# Altium footprint library 2.52-直插元件.PcbLib: 467 footprints (part 3 of 30)
Each footprint in its own frame and in the unit in brackets; x right, y up, seen from the top. Pads: shape width x height; smd on the part's side, far side on the other; paste and mask are expansions set on the pad; w line width, h text height; cw(c..) or ccw(c..) is an arc to the next point about the centre after c.
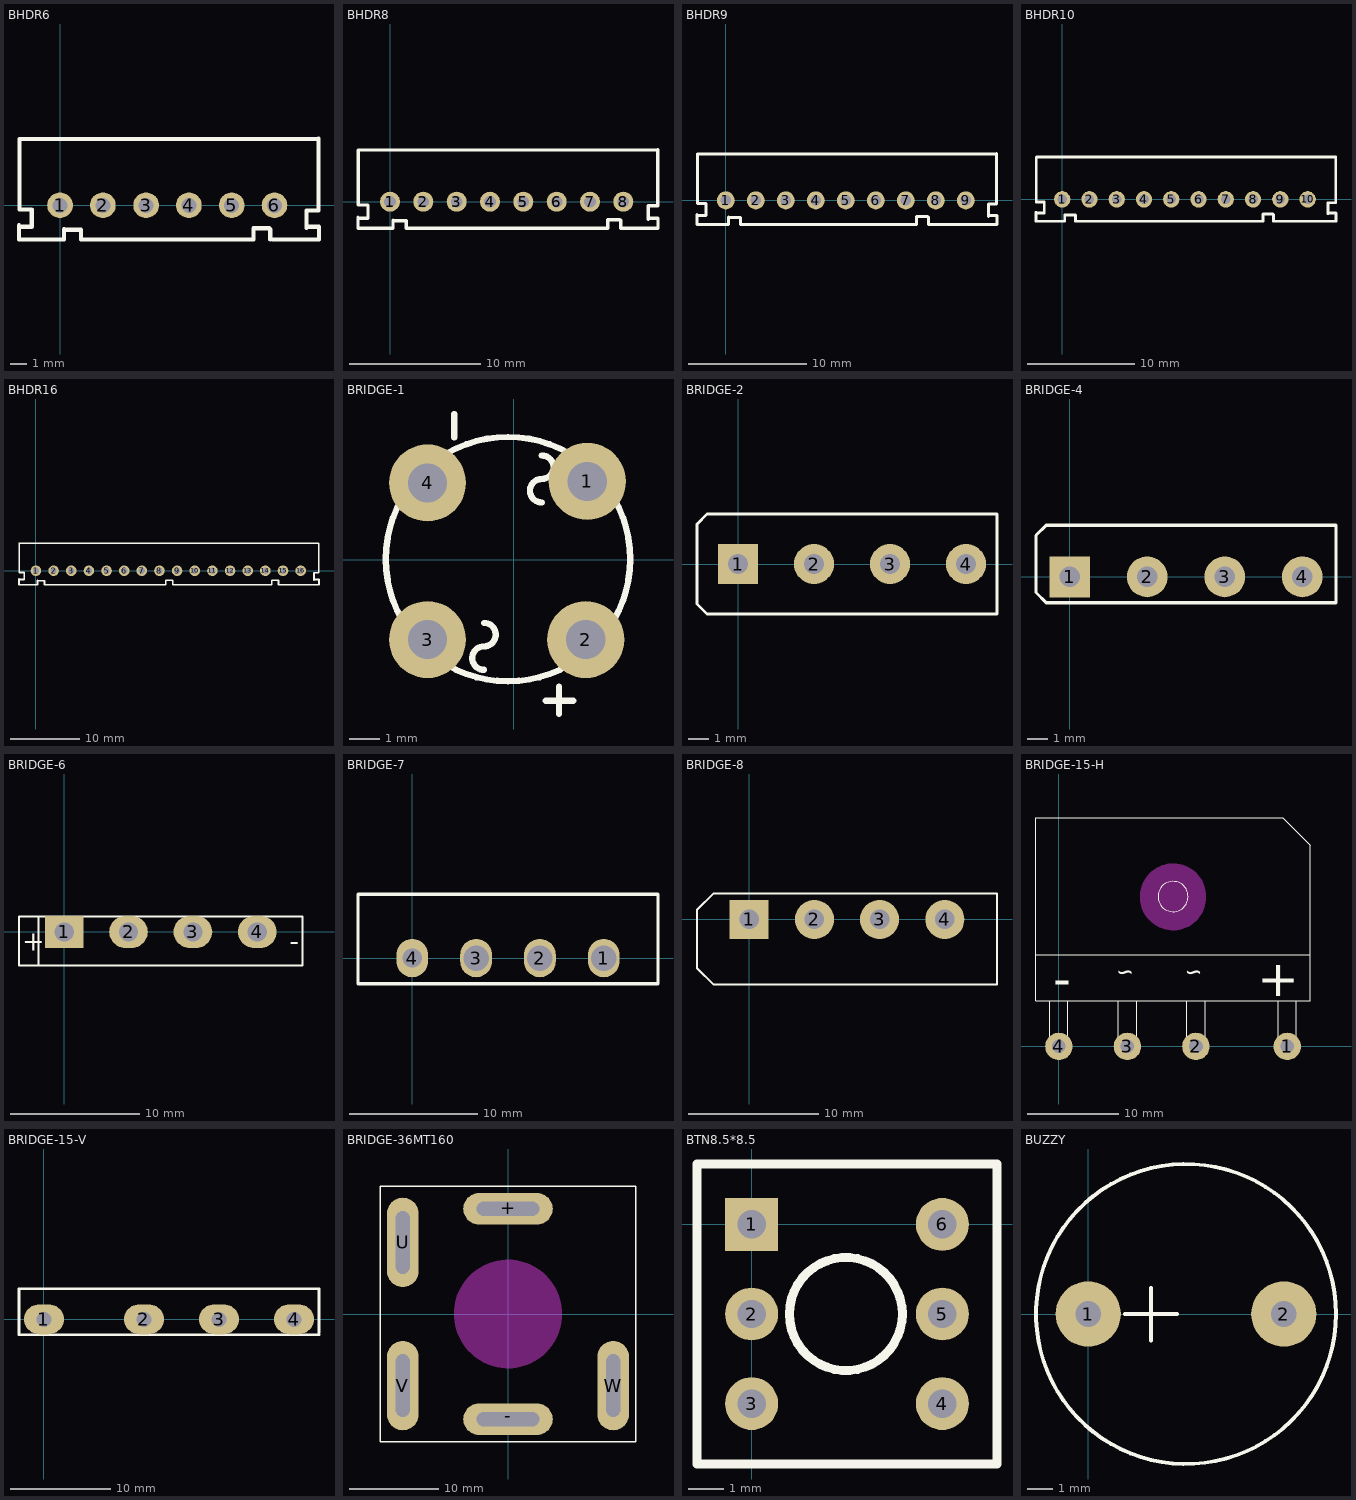
[diagram p2: the footprints below, top view; thin cyan lines are the x and y axes]

## BHDR6 [mil]
pads (6):
  round 60 hole 35: 1(0,0) 2(100,0) 3(201,0) 4(301,0) 5(401,0) 6(501,0)
Top Overlay:
  lines w10: -96,-50 -66,-50 -66,-10 -95,-10 -95,134 ; -96,-47 -96,-80 ; -95,-79 -96,-80 ; -95,103 -95,154 -94,155 -31,155 ; -73,155 93,155 ; 82,155 575,155 ; 276,155 442,155 ; 376,155 495,155 602,155 ; 491,-80 491,-56 489,-54 452,-54 452,-80 49,-80 49,-57 10,-57 9,-56 9,-80 -96,-80 ; 496,-80 601,-80 ; 576,-53 576,-12 604,-12 604,156 ; 576,-50 605,-50 605,-80

## BHDR8 [mil]
pads (8):
  round 60 hole 35: 1(0,0) 2(100,0) 3(200,0) 4(300,0) 5(400,0) 6(500,0) 7(600,0) 8(700,0)
Top Overlay:
  lines w10: -96,-50 -66,-50 -66,-10 -95,-10 -95,134 ; -96,-47 -96,-80 ; -95,-79 -96,-80 ; -95,103 -95,154 -94,155 -31,155 ; -73,155 93,155 ; 82,155 575,155 694,155 801,155 ; 168,155 439,155 ; 200,-80 248,-80 ; 371,-80 653,-80 653,-54 690,-54 692,-56 692,-80 ; 458,-80 49,-80 49,-57 10,-57 9,-56 9,-80 -96,-80 ; 475,155 641,155 ; 695,-80 800,-80 ; 775,-53 775,-12 803,-12 803,156 ; 775,-50 804,-50 804,-80

## BHDR9 [mil]
pads (9):
  round 60 hole 35: 1(0,0) 2(100,0) 3(200,0) 4(300,0) 5(400,0) 6(500,0) 7(600,0) 8(700,0) 9(800,0)
Top Overlay:
  lines w10: -96,-50 -66,-50 -66,-10 -95,-10 -95,134 ; -96,-47 -96,-80 ; -95,-79 -96,-80 ; -95,103 -95,154 -94,155 -31,155 ; -73,155 93,155 ; 82,155 575,155 741,155 ; 168,155 439,155 ; 200,-80 248,-80 ; 371,-80 636,-80 636,-54 673,-54 675,-56 675,-80 774,-80 ; 458,-80 49,-80 49,-57 10,-57 9,-56 9,-80 -96,-80 ; 675,155 794,155 901,155 ; 743,-80 795,-80 900,-80 ; 875,-53 875,-12 903,-12 903,156 ; 875,-50 904,-50 904,-80

## BHDR10 [mil]
pads (10):
  round 60 hole 35: 1(0,0) 2(100,0) 3(200,0) 4(300,0) 5(400,0) 6(500,0) 7(600,0) 8(700,0) 9(800,0) 10(900,0)
Top Overlay:
  lines w10: -96,-50 -66,-50 -66,-10 -95,-10 -95,134 ; -96,-47 -96,-80 ; -95,-79 -96,-80 ; -95,103 -95,154 -94,155 -31,155 ; -73,155 93,155 ; 82,155 675,155 841,155 ; 168,155 439,155 ; 200,-80 248,-80 ; 371,-80 736,-80 736,-54 773,-54 775,-56 775,-80 874,-80 ; 458,-80 49,-80 49,-57 10,-57 9,-56 9,-80 -96,-80 ; 775,155 894,155 1001,155 ; 843,-80 895,-80 1000,-80 ; 975,-53 975,-12 1003,-12 1003,156 ; 975,-50 1004,-50 1004,-80

## BHDR16 [mil]
pads (16):
  round 60 hole 35: 1(0,0) 2(100,0) 3(200,0) 4(300,0) 5(400,0) 6(500,0) 7(600,0) 8(700,0) 9(800,0) 10(900,0) 11(1000,0) 12(1100,0) 13(1200,0) 14(1300,0) 15(1400,0) 16(1500,0)
Top Overlay:
  lines w10: -96,-50 -66,-50 -66,-10 -95,-10 -95,134 ; -96,-47 -96,-80 ; -95,-79 -96,-80 ; -95,103 -95,154 -94,155 -31,155 ; -73,155 93,155 ; 82,155 675,155 841,155 ; 168,155 439,155 ; 200,-80 248,-80 ; 371,-80 736,-80 736,-54 773,-54 775,-56 775,-80 874,-80 ; 458,-80 49,-80 49,-57 10,-57 9,-56 9,-80 -96,-80 ; 775,155 894,155 1295,155 ; 843,-80 895,-80 1000,-80 ; 971,-80 1336,-80 1336,-54 1373,-54 1375,-56 1375,-80 1474,-80 ; 1275,155 1441,155 ; 1375,155 1494,155 1601,155 ; 1443,-80 1495,-80 1600,-80 ; 1575,-53 1575,-12 1603,-12 1603,156 ; 1575,-50 1604,-50 1604,-80

## BRIDGE-1 [mm] "淘宝ID:黄晶宝石   店铺网址:https://shop463601444.taobao.com"
pads (4):
  round 2.5 hole 1.27: 1(2.388,2.54) 2(2.337,-2.591) 3(-2.794,-2.591) 4(-2.794,2.489)
Top Overlay:
  circle w0.203: c-0.184,0.018 r3.962
  lines w0.203: -1.93,3.962 -1.93,4.724 ; -0.963,-3.573 cw(c-0.963,-3.192) -0.963,-2.811 ccw(c-0.963,-2.43) -0.963,-2.049 ; 0.91,1.856 cw(c0.91,2.237) 0.91,2.618 ccw(c0.91,2.999) 0.91,3.38 ; 1.041,-4.572 1.93,-4.572 ; 1.473,-5.004 1.473,-4.115
3D body "User Library-Silicon Bridge Rectifiers 2W10.STEP": height 7.62, standoff -10.38, extent -4.724,-4.449 4.276,4.551

## BRIDGE-2 [mm] "淘宝ID:黄晶宝石   店铺网址:https://shop463601444.taobao.com"
pads (4):
  rect 2x2 hole 1: 1(0,0)
  round 2 hole 1: 2(3.8,0) 3(7.6,0) 4(11.4,0)
Top Overlay:
  lines w0.15: -2.053,-1.997 -2.053,2.003 -2.047,2.003 -1.55,2.5 12.95,2.5 12.95,-2.5 -1.55,-2.5 -2.053,-1.997 ; -2.053,-1.997 -2.053,-1.997
3D body "User Library-3N246.step": height 12.59, standoff -13.79, extent -1.477,-2.419 13.243,2.425

## BRIDGE-4 [mm] "淘宝ID:黄晶宝石   店铺网址:https://shop463601444.taobao.com"
pads (4):
  rect 2x2 hole 1: 1(0,0)
  round 2 hole 1: 2(3.8,0) 3(7.6,0) 4(11.4,0)
Top Overlay:
  lines w0.15: -1.65,-0.767 -1.147,-1.27 13.05,-1.27 13.05,2.53 -1.153,2.53 -1.65,2.033 -1.65,-0.767
3D body "零?": height 12.09, standoff -4.09, extent -1.665,-1.27 13.065,2.53

## BRIDGE-6 [mm] "淘宝ID:黄晶宝石   店铺网址:https://shop463601444.taobao.com"
pads (4):
  rect 3x2.5 hole 1.5: 1(0,0)
  oval 3x2.5 hole 1.5: 2(5,0) 3(10,0) 4(15,0)
Top Overlay:
  lines w0.15: -2,-2.6 -2,1.2 ; -3.5,-2.6 -3.5,1.2 18.5,1.2 18.5,-2.6 -3.5,-2.6
  text "-" at 18.261,-1.462 h1.52
  text "+" at -3.261,-1.462 h1.52
3D body "User Library-bridge 2.step": height 21, standoff -15.63, extent -3.65,-2.58 18.65,1.18

## BRIDGE-7 [mm] "淘宝ID:黄晶宝石   店铺网址:https://shop463601444.taobao.com"
pads (4):
  oval 2.5x3 hole 2: 1(15.001,0) 2(10,0) 3(5.001,0)
  oval 2.5x3 hole 1.5: 4(0,0)
Top Overlay:
  lines w0.254: -4.25,-2 -4.25,5 19.25,5 19.25,-2 -4.25,-2
3D body "User Library-bridge-9528.step": height 10.75, standoff -9.75, extent -2.509,-1.347 18.291,2.153

## BRIDGE-8 [mm] "淘宝ID:黄晶宝石   店铺网址:https://shop463601444.taobao.com"
pads (4):
  rect 3x3 hole 1.5: 1(0,0)
  round 3 hole 1.5: 2(5,0) 3(10,0) 4(15,0)
Top Overlay:
  lines w0.15: -2.725,-5.001 -4,-3.726 -4,0.725 -2.725,2 19,2 19,-5 -2.725,-5
3D body "User Library-KBU1010.step": height 19.74, standoff -27.96, extent -4.318,-5.069 19.396,2.032

## BRIDGE-15-H [mm]
pads (4):
  round 3 hole 1.5: 1(25,0) 2(15,0) 3(7.5,0) 4(0,0)
Top Overlay:
  circle w0.1: c12.5,16.4 r1.65
  lines w0.1: -2.5,10 27.5,10 ; -1,5 -1,1 -0.5,0.5 0.5,0.5 1,1 1,5 ; 6.5,5 6.5,1 7,0.5 8,0.5 8.5,1 8.5,5 ; 14,5 14,1 14.5,0.5 15.5,0.5 16,1 16,5 ; 24,5 24,1 24.5,0.5 25.5,0.5 26,1 26,5 ; 24.5,25 27.5,22 27.5,5 -2.5,5 -2.5,25 24.5,25 ; 24.5,25 24.5,25
  text "～" at 8.833,6.18 h4
  text "+" at 26.333,5.501 h4
  text "～" at 16.333,6.18 h4
  text "-" at 1.333,5.501 h4
Keep-Out Layer:
  board cut-out: 8.9,16.363 8.9,16.598 8.962,17.064 9.083,17.519 9.263,17.954 9.499,18.361 9.785,18.734 10.118,19.067 10.491,19.353 10.899,19.589 11.333,19.769 11.788,19.89 12.254,19.952 12.489,19.952 12.51,19.952 12.745,19.952 13.212,19.89 13.667,19.769 14.101,19.589 14.509,19.353 14.882,19.067 15.215,18.734 15.501,18.361 15.737,17.953 15.917,17.518 16.039,17.064 16.1,16.597 16.1,16.362 16.1,16.126 16.038,15.658 15.916,15.202 15.736,14.766 15.5,14.358 15.213,13.983 14.879,13.649 14.504,13.362 14.096,13.126 13.66,12.946 13.204,12.823 12.736,12.762 12.5,12.762 12.48,12.762 12.245,12.762 11.78,12.823 11.327,12.945 10.893,13.124 10.487,13.359 10.115,13.644 9.783,13.976 9.497,14.349 9.263,14.755 9.083,15.189 8.962,15.642 8.9,16.107 8.9,16.342
Keep-Out Layer:
  circle w0.1: c12.5,16.357 r3.6
3D body "bridge-15A-V.STEP": height 10, standoff -4.15, extent -2.5,-0.347 27.5,26.403

## BRIDGE-15-V [mm]
pads (4):
  oval 4x3 hole 1.5: 1(0,0) 2(10,0) 3(17.5,0) 4(25,0)
Top Overlay:
  lines w0.254: 27.5,-1.55 -2.5,-1.55 -2.5,3.05 27.5,3.05 27.5,-1.35
3D body "User Library-bridge-irxb25.STEP": height 24, standoff -13.5, extent -2.5,-1.55 27.5,3.05

## BRIDGE-36MT160 [mm]
pads (5):
  oval 10x3.5 hole 1.6 slot 7 at 0 deg: +(0,11.75) -(0,-11.75)
  oval 3.5x10 hole 1.6 slot 7 at 90 deg: U(-11.75,7.989) V(-11.75,-7.989) W(11.75,-7.989)
Top Overlay:
  lines w0.15: -14.25,-14.25 -14.25,14.25 14.25,14.25 14.25,-14.25 -14.25,-14.25
Keep-Out Layer:
  board cut-out: 6.001,0.006 6.001,0.3 5.943,0.887 5.828,1.464 5.657,2.028 5.432,2.572 5.154,3.092 4.827,3.581 4.453,4.037 4.037,4.453 3.582,4.827 3.092,5.154 2.572,5.432 2.028,5.657 1.465,5.828 0.887,5.943 0.301,6.001 0.006,6.001 -0.103,6.001 -0.489,6.001 -1.255,5.9 -2.002,5.7 -2.716,5.404 -3.385,5.018 -3.998,4.548 -4.545,4.001 -5.015,3.388 -5.401,2.719 -5.697,2.005 -5.897,1.258 -5.998,0.492 -5.998,0.106 -5.998,0.006 -5.998,-0.289 -5.94,-0.877 -5.825,-1.456 -5.653,-2.021 -5.427,-2.567 -5.149,-3.088 -4.821,-3.579 -4.446,-4.035 -4.029,-4.453 -3.572,-4.827 -3.081,-5.155 -2.561,-5.434 -2.015,-5.66 -1.45,-5.831 -0.871,-5.946 -0.283,-6.004 0.012,-6.004 0.017,-6.004 0.311,-6.004 0.896,-5.946 1.473,-5.832 2.035,-5.661 2.579,-5.436 3.097,-5.159 3.586,-4.832 4.041,-4.459 4.456,-4.044 4.829,-3.589 5.156,-3.1 5.433,-2.582 5.658,-2.038 5.829,-1.476 5.943,-0.899 6.001,-0.314 6.001,-0.02
Keep-Out Layer:
  circle w0.1: c0,0 r6
Mechanical 1:
  lines w0.1: -12.55,-10.989 ccw(c-11.75,-10.989) -10.95,-10.989 -10.95,-4.989 ccw(c-11.75,-4.989) -12.55,-4.989 -12.55,-10.989 ; -12.55,4.989 ccw(c-11.75,4.989) -10.95,4.989 -10.95,10.989 ccw(c-11.75,10.989) -12.55,10.989 -12.55,4.989 ; -3,-12.55 cw(c-3,-11.75) -3,-10.95 3,-10.95 cw(c3,-11.75) 3,-12.55 -3,-12.55 ; -3,10.95 cw(c-3,11.75) -3,12.55 3,12.55 cw(c3,11.75) 3,10.95 -3,10.95 ; 10.95,-10.989 ccw(c11.75,-10.989) 12.55,-10.989 12.55,-4.989 ccw(c11.75,-4.989) 10.95,-4.989 10.95,-10.989
3D body "User Library-36MT160-1.STEP": height 10.5, standoff -10.5, extent -14.25,-14.25 14.25,14.25

## BTN8.5*8.5 [mm]
pads (6):
  rect 1.5x1.5 hole 0.8: 1(0,0)
  round 1.5 hole 0.8: 2(0,-2.54) 3(0,-5.08) 4(5.4,-5.08) 5(5.4,-2.54) 6(5.4,0)
Top Overlay:
  circle w0.254: c2.667,-2.54 r1.6
  lines w0.254: -1.55,-6.79 6.95,-6.79 6.95,1.71 -1.55,1.71 -1.55,-6.79

## BUZZY [mm]
pads (2):
  round 2.54 hole 1: 1(0,0) 2(7.62,0)
Top Overlay:
  circle w0.15: c3.81,0 r5.842
  lines w0.15: 1.424,0 3.464,0 ; 2.45,-1.026 2.45,1.014
3D body "User Library-Kobitone_Buzzer.step": height 7.38, standoff -5.7, extent -2.108,-5.918 9.728,5.918